# Altium footprint library A.PcbLib: 34 footprints (part 3 of 3)
Each footprint in its own frame and in the unit in brackets; x right, y up, seen from the top. Pads: shape width x height; smd on the part's side, far side on the other; paste and mask are expansions set on the pad; w line width, h text height; cw(c..) or ccw(c..) is an arc to the next point about the centre after c.
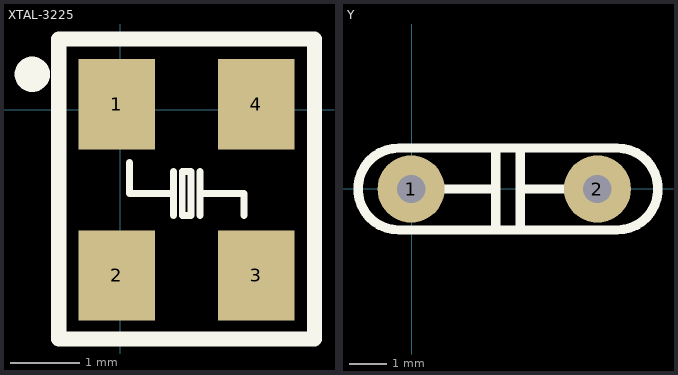
[diagram p2: the footprints below, top view; thin cyan lines are the x and y axes]

## XTAL-3225 [mm]
pads (4):
  rect 1.1x1.3 smd: 1(-0.051,0.076) 2(-0.051,-2.388) 3(1.956,-2.388) 4(1.956,0.076)
Top Overlay:
  circle w0.254: c-1.27,0.508 r0.127
  lines w0.1: 0.127,-0.762 0.127,-1.206 0.762,-1.206 ; 0.762,-1.524 0.762,-0.889 ; 1.143,-1.524 1.143,-0.889 ; 1.143,-1.206 1.778,-1.206 1.778,-1.524 ; 0.889,-1.524 0.889,-0.889 1.016,-0.889 1.016,-1.524 0.889,-1.524
  lines w0.22: -0.889,-3.302 2.794,-3.302 2.794,1.016 -0.889,1.016 -0.889,-3.302
3D body "XTAL-3225.STEP": height 0.8, standoff 0, extent -0.336,-2.743 2.164,0.457

## Y [mm]
pads (2):
  round 1.8 hole 0.762: 1(-0.011,-0.011) 2(4.989,-0.011)
Top Overlay:
  lines w0.254: -0.011,-0.011 2.264,-0.011 ; 2.264,-0.986 2.264,0.964 ; 2.914,-0.986 2.914,0.964 ; 2.914,-0.011 4.989,-0.011 ; -0.336,-1.111 cw(c-0.336,-0.011) -0.336,1.089 5.514,1.089 cw(c5.514,-0.011) 5.514,-1.111 -0.336,-1.111
3D body "CAP TR5.0.STEP": height 11, standoff -1.57, extent -1.411,-1.271 6.589,1.239